# Altium footprint library ThanhNT.PcbLib: 579 footprints (part 23 of 37)
Each footprint in its own frame and in the unit in brackets; x right, y up, seen from the top. Pads: shape width x height; smd on the part's side, far side on the other; paste and mask are expansions set on the pad; w line width, h text height; cw(c..) or ccw(c..) is an arc to the next point about the centre after c.
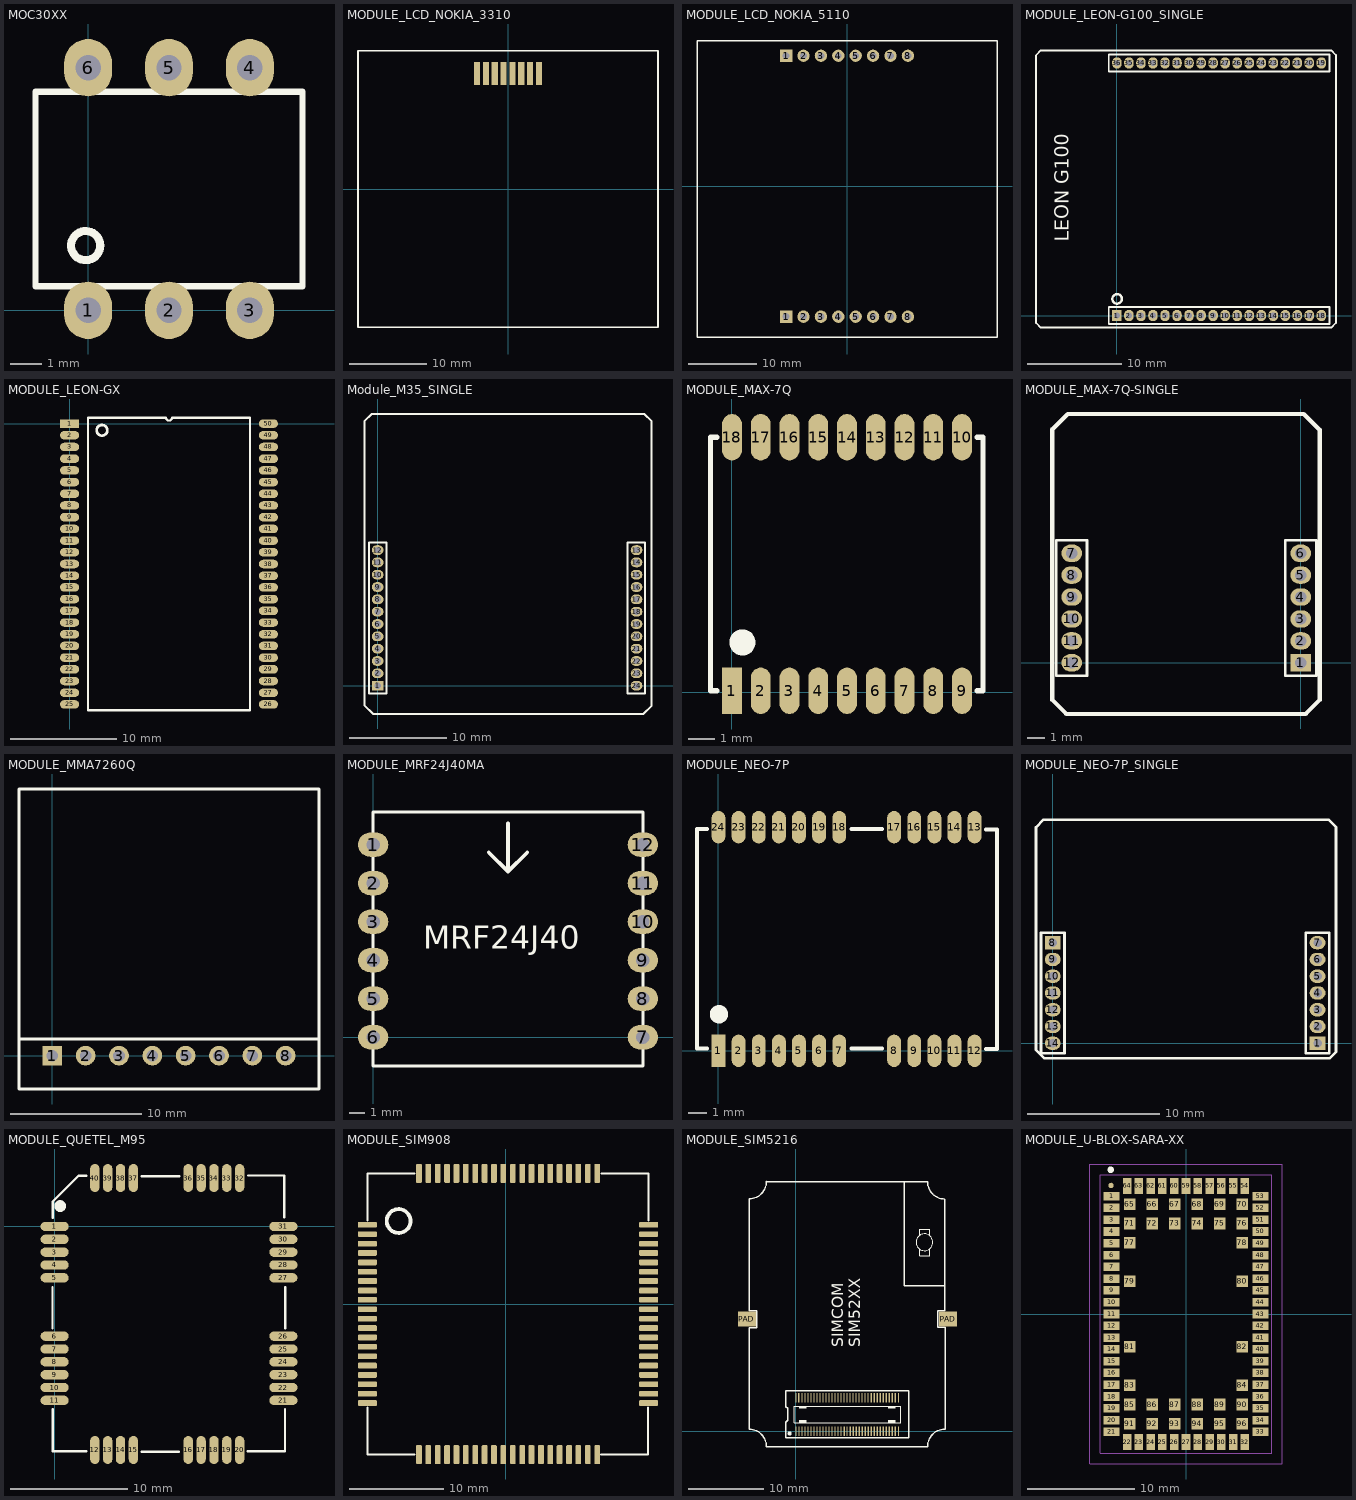
[diagram p22: the footprints below, top view; thin cyan lines are the x and y axes]

## MOC30XX [mm]
pads (6):
  oval 1.5x1.8 hole 0.8: 1(0,0) 2(2.54,0) 3(5.08,0) 4(5.08,7.62) 5(2.54,7.62) 6(0,7.62)
Top Overlay:
  circle w0.254: c-0.077,2.032 r0.458
  lines w0.2: -1.651,0.762 6.731,0.762 6.731,6.858 -1.651,6.858 -1.651,0.762
3D body "SW3DPS-DIP6-DEFAULT.step": height 4.41, standoff -3.18, extent -1.5,-0.19 6.58,7.81

## MODULE_LCD_NOKIA_3310 [mm] "NOKIA 3310 LCD"
height 3
pads (8):
  rect 0.8x3 smd: 1(4.025,15) 2(2.875,15) 3(1.725,15) 4(0.575,15) 5(-0.575,15) 6(-1.725,15) 7(-2.875,15) 8(-4.025,15)
Top Overlay:
  lines w0.2: -19.5,-18 -19.5,18 19.5,18 19.5,-18 -19.5,-18
3D body "NOKIA 3310.STEP": height 2.06, standoff 0.04, extent -19.25,-17.75 19.25,17.75

## MODULE_LCD_NOKIA_5110 [mm] "NOKIA 5110 LCD"
height 10.254
pads (16):
  rect 1.8x1.8 hole 1: 1(-8.89,-19.05) 1(-8.89,19.05)
  round 1.8 hole 1: 2(-6.35,-19.05) 2(-6.35,19.05) 3(-3.81,-19.05) 3(-3.81,19.05) 4(-1.27,-19.05) 4(-1.27,19.05) 5(1.27,-19.05) 5(1.27,19.05) 6(3.81,-19.05) 6(3.81,19.05) 7(6.35,-19.05) 7(6.35,19.05) 8(8.89,-19.05) 8(8.89,19.05)
Top Overlay:
  lines w0.2: -21.9,-22.029 -21.9,21.209 21.9,21.209 21.9,-22.029 -21.9,-22.029
3D body "NOKIA 5110 BreakOut Board.STEP": height 11.5, standoff 6.5, extent -21.876,-22.031 21.724,21.269
3D body "User Library-Header_Male_8Pin.STEP": height 8.54, standoff -3, extent -10.185,-20.269 10.135,-17.779
3D body "User Library-Header_Male_8Pin.STEP": height 8.54, standoff -3, extent -10.16,17.855 10.16,20.345

## MODULE_LEON-G100_SINGLE [mm]
pads (36):
  rect 1x1.2 hole 0.65: 1(0,0)
  oval 1x1.2 hole 0.65: 2(1.27,0) 3(2.54,0) 4(3.81,0) 5(5.08,0) 6(6.35,0) 7(7.62,0) 8(8.89,0) 9(10.16,0) 10(11.43,0) 11(12.7,0) 12(13.97,0) 13(15.24,0) 14(16.51,0) 15(17.78,0) 16(19.05,0) 17(20.32,0) 18(21.59,0) 19(21.59,26.67) 20(20.32,26.67) 21(19.05,26.67) 22(17.78,26.67) 23(16.51,26.67) 24(15.24,26.67) 25(13.97,26.67) 26(12.7,26.67) 27(11.43,26.67) 28(10.16,26.67) 29(8.89,26.67) 30(7.62,26.67) 31(6.35,26.67) 32(5.08,26.67) 33(3.81,26.67) 34(2.54,26.67) 35(1.27,26.67) 36(0,26.67)
Top Overlay:
  circle w0.25: c0.025,1.753 r0.5
  lines w0.2: -8.544,-0.778 -8.544,27.473 -8.026,27.991 22.657,27.991 23.139,27.508 23.139,-0.787 22.657,-1.27 -8.052,-1.27 -8.544,-0.778 ; -0.864,-0.914 22.454,-0.914 22.454,0.914 -0.864,0.914 -0.864,-0.914 ; -0.864,25.756 -0.864,27.584 22.454,27.584 22.454,25.756 -0.864,25.756
  text "LEON G100" at -4.547,7.798 h2.54

## MODULE_LEON-GX [mm]
pads (50):
  rect 1.8x0.8 smd: 1(0,0)
  oval 1.8x0.8 smd: 2(0,-1.1) 3(0,-2.2) 4(0,-3.3) 5(0,-4.4) 6(0,-5.5) 7(0,-6.6) 8(0,-7.7) 9(0,-8.8) 10(0,-9.9) 11(0,-11) 12(0,-12.1) 13(0,-13.2) 14(0,-14.3) 15(0,-15.4) 16(0,-16.5) 17(0,-17.6) 18(0,-18.7) 19(0,-19.8) 20(0,-20.9) 21(0,-22) 22(0,-23.1) 23(0,-24.2) 24(0,-25.3) 25(0,-26.4) 26(18.7,-26.4) 27(18.7,-25.3) 28(18.7,-24.2) 29(18.7,-23.1) 30(18.7,-22) 31(18.7,-20.9) 32(18.7,-19.8) 33(18.7,-18.7) 34(18.7,-17.6) 35(18.7,-16.5) 36(18.7,-15.4) 37(18.7,-14.3) 38(18.7,-13.2) 39(18.7,-12.1) 40(18.7,-11) 41(18.7,-9.9) 42(18.7,-8.8) 43(18.7,-7.7) 44(18.7,-6.6) 45(18.7,-5.5) 46(18.7,-4.4) 47(18.7,-3.3) 48(18.7,-2.2) 49(18.7,-1.1) 50(18.7,0)
Top Overlay:
  circle w0.25: c3.048,-0.635 r0.5
  lines w0.2: 1.735,-26.95 16.965,-26.95 16.965,0.55 9.625,0.55 cw(c9.35,0.55) 9.075,0.55 1.735,0.55 1.735,-26.95
3D body "User Library-LEON-G200.STEP": height 3.3, standoff -0.02, extent 0,-27.95 18.92,1.55

## Module_M35_SINGLE [mm]
pads (24):
  rect 1.2x1 hole 0.65: 1(0,0)
  oval 1.2x1 hole 0.65: 2(0,1.27) 3(0,2.54) 4(0,3.81) 5(0,5.08) 6(0,6.35) 7(0,7.62) 8(0,8.89) 9(0,10.16) 10(0,11.43) 11(0,12.7) 12(0,13.97) 13(26.67,13.97) 14(26.67,12.7) 15(26.67,11.43) 16(26.67,10.16) 17(26.67,8.89) 18(26.67,7.62) 19(26.67,6.35) 20(26.67,5.08) 21(26.67,3.81) 22(26.67,2.54) 23(26.67,1.27) 24(26.67,0)
Top Overlay:
  lines w0.2: -1.372,-2.032 -0.483,-2.921 27.356,-2.921 28.219,-2.057 28.219,27.254 27.483,27.991 -0.635,27.991 -1.372,27.254 -1.372,-2.032 ; -0.914,-0.813 0.889,-0.813 0.889,14.732 -0.914,14.732 -0.914,-0.813 ; 25.756,-0.813 25.756,14.732 27.559,14.732 27.559,-0.813 25.756,-0.813

## MODULE_MAX-7Q [mil]
pads (18):
  rect 30x70 smd: 1(0,1.97)
  oval 30x70 smd: 2(43.31,1.97) 3(86.61,1.97) 4(129.92,1.97) 5(173.23,1.97) 6(216.54,1.97) 7(259.84,1.97) 8(303.15,1.97) 9(346.46,1.97) 10(346.46,383.86) 11(303.15,383.86) 12(259.84,383.86) 13(216.54,383.86) 14(173.23,383.86) 15(129.92,383.86) 16(86.61,383.86) 17(43.31,383.86) 18(0,383.86)
Top Overlay:
  circle w19.68: c15.75,74.8 r9.84
  lines w7.87: -22.64,1.97 -32.48,1.97 -32.48,383.86 -22.64,383.86 ; 369.09,1.97 377.95,1.97 377.95,383.86 369.09,383.86
3D body "User Library-L70.STEP": height 98.93, standoff 0.11, extent -25.59,1.18 372.05,383.86

## MODULE_MAX-7Q-SINGLE [mm]
pads (12):
  rect 1.2x1 hole 0.65: 1(0,0)
  oval 1.2x1 hole 0.65: 2(0,1.27) 3(0,2.54) 5(0,5.08) 7(-13.284,6.35) 8(-13.284,5.08) 9(-13.284,3.81) 10(-13.284,2.54) 11(-13.284,1.27) 12(-13.284,0)
  oval 1.2x1 hole 0.65 paste+0: 4(0,3.81) 6(0,6.35)
Top Overlay:
  lines w0.15: -14.173,-0.762 -12.395,-0.762 -12.395,7.112 -14.173,7.112 -14.173,-0.762 ; -0.889,-0.762 -0.889,7.112 0.889,7.112 0.889,-0.762 -0.889,-0.762
  lines w0.254: -14.402,-2.159 -13.589,-2.972 0.279,-2.972 1.092,-2.159 1.092,13.513 0.178,14.427 -13.513,14.427 -14.402,13.538 -14.402,-2.159

## MODULE_MMA7260Q [mm] "Connector; Header; 8 Position"
pads (8):
  rect 1.5x1.5 hole 0.9: 1(0,0)
  round 1.5 hole 0.9: 2(2.54,0) 3(5.08,0) 4(7.62,0) 5(10.16,0) 6(12.7,0) 7(15.24,0) 8(17.78,0)
Top Overlay:
  lines w0.2: -2.54,1.27 20.32,1.27 ; -2.54,-2.54 -2.54,20.32 20.32,20.32 20.32,-2.54 -2.54,-2.54
3D body: height 2, standoff 1, extent 7.62,7.62 13.97,13.97
3D body: height 1, standoff 0, extent -2.54,-2.54 20.32,20.32

## MODULE_MRF24J40MA [mm] "Microchip Zigbee Module"
pads (12):
  oval 2x1.6 hole 0.9: 1(0,12.7) 2(0,10.16) 3(0,7.62) 4(0,5.08) 5(0,2.54) 6(0,0) 7(17.78,0) 8(17.78,2.54) 9(17.78,5.08) 10(17.78,7.62) 11(17.78,10.16) 12(17.78,12.7)
Top Overlay:
  lines w0.2: 0,8.255 0,-1.905 ; 0,-1.905 17.78,-1.905 17.78,14.859 0,14.859 0,-1.905
  lines w0.254: 7.62,12.192 8.89,10.922 ; 8.89,14.097 8.89,10.922 ; 10.16,12.192 8.89,10.922
  text "MRF24J40" at 3.302,5.842 h1.52
3D body "User Library-MRF24J40MA2.STEP": height 3.11, standoff 0.01, extent 0,-13.691 17.78,14.249

## MODULE_NEO-7P [mil]
pads (24):
  rect 30x70 smd: 1(0,0)
  oval 30x70 smd: 2(43.31,0) 3(86.61,0) 4(129.92,0) 5(173.23,0) 6(216.54,0) 7(259.84,0) 8(377.95,0) 9(421.26,0) 10(464.57,0) 11(507.87,0) 12(551.18,0) 13(551.18,481.3) 14(507.87,481.3) 15(464.57,481.3) 16(421.26,481.3) 17(377.95,481.3) 18(259.84,481.3) 19(216.54,481.3) 20(173.23,481.3) 21(129.92,481.3) 22(86.61,481.3) 23(43.31,481.3) 24(0,481.3)
Top Overlay:
  circle w19.68: c0.98,78.74 r9.84
  lines w7.87: -24.61,4.92 -46.26,4.92 -46.26,477.36 -24.61,477.36 ; 285.43,4.92 352.36,4.92 ; 285.43,477.36 352.36,477.36 ; 575.79,3.94 599.41,3.94 599.41,476.38 575.79,476.38
3D body "User Library-UBLOX_GPS_NEO-6M.STEP": height 103.94, standoff 0, extent -51.18,-2.95 602.36,483.66

## MODULE_NEO-7P_SINGLE [mm]
pads (14):
  rect 1.2x1 hole 0.65: 1(20.066,0) 8(0,7.62)
  oval 1.2x1 hole 0.65: 2(20.066,1.27) 3(20.066,2.54) 4(20.066,3.81) 5(20.066,5.08) 6(20.066,6.35) 7(20.066,7.62) 9(0,6.35) 10(0,5.08) 11(0,3.81) 12(0,2.54) 13(0,1.27) 14(0,0)
Top Overlay:
  lines w0.2: -1.27,-0.508 -1.27,16.358 -0.686,16.942 20.904,16.942 21.463,16.383 21.463,-0.66 20.98,-1.143 -0.635,-1.143 -1.27,-0.508 ; -0.889,-0.762 0.889,-0.762 0.889,8.382 -0.889,8.382 -0.889,-0.762 ; 19.177,-0.762 19.177,8.382 20.955,8.382 20.955,-0.762 19.177,-0.762

## MODULE_QUETEL_M95 [mm]
pads (40):
  oval 2.4x0.8 smd: 1(0,0) 2(0,-1.1) 3(0,-2.2) 4(0,-3.3) 5(0,-4.4) 6(0,-9.4) 7(0,-10.5) 8(0,-11.6) 9(0,-12.7) 10(0,-13.8) 11(0,-14.9) 21(19.6,-14.9) 22(19.6,-13.8) 23(19.6,-12.7) 24(19.6,-11.6) 25(19.6,-10.5) 26(19.6,-9.4) 27(19.6,-4.4) 28(19.6,-3.3) 29(19.6,-2.2) 30(19.6,-1.1) 31(19.6,0)
  oval 0.8x2.4 smd: 12(3.45,-19.15) 13(4.55,-19.15) 14(5.65,-19.15) 15(6.75,-19.15) 16(11.45,-19.15) 17(12.55,-19.15) 18(13.65,-19.15) 19(14.75,-19.15) 20(15.85,-19.15) 32(15.85,4.15) 33(14.75,4.15) 34(13.65,4.15) 35(12.55,4.15) 36(11.45,4.15) 37(6.75,4.15) 38(5.65,4.15) 39(4.55,4.15) 40(3.45,4.15)
Top Overlay:
  circle w0.5: c0.476,1.748 r0.25
  lines w0.2: -0.178,-8.712 -0.178,-5.182 ; -0.152,-15.646 -0.152,-19.253 2.718,-19.253 ; -0.152,0.737 -0.152,2.134 2.057,4.343 2.718,4.343 ; 7.442,-19.304 10.643,-19.304 ; 7.468,4.293 10.668,4.293 ; 16.535,-19.253 19.736,-19.253 19.736,-15.646 ; 16.561,4.369 19.685,4.369 19.685,0.762 ; 19.761,-8.712 19.761,-5.182
3D body "User Library-Quectel M95.STEP": height 2.66, standoff 0, extent -0.146,-19.282 19.754,4.318

## MODULE_SIM908 [mil]
pads (80):
  rrect30% 79x24 smd: ADC(600,-178.35) DISP-CLK(-581.1,137) DISP-CS(-581.1,19) DISP-DATA(-581.1,98) DISP-DC(-581.1,58) GND(-581.1,334) GND2(-581.1,295) GND3(-581.1,176) GND4(-581.1,-20.87) GND5(-581.1,-178.35) GND8(600,-414.57) GND9(600,-335.83) GND10(600,216) GND11(600,255) GND12(600,334) GPS-DBG-RXD(-581.1,-257.09) GPS-DBG-TXD(-581.1,-217.72) GSM-ANTINA(600,295) NC(-581.1,216) NC2(-581.1,-60.24) NC3(-581.1,-99.61) NC4(-581.1,-138.98) NC9(600,-257.09) NC10(600,-217.72) NC11(600,58) NC12(600,98) NETLIGHT(600,-20.87) PWM1(600,-138.98) PWM2(600,-99.61) PWM3(600,-60.24) PWRKEY(-581.1,255) SCL(600,137) SDA(600,176) SIM-CLK(-581.1,-375.2) SIM-DATA(-581.1,-296.46) SIM-RST(-581.1,-335.83) SIM-VDD(-581.1,-414.57) STATUS(600,19) VDD-EXT(600,-296.46) VRTC(600,-375.2)
  rrect30% 24x79 smd: CTS(148,550) DCD(30,550) DTR(-49.61,550) GND6(266,-631.1) GND7(384,-631.1) GND13(-364.57,550) GND14(-285.83,550) GND15(-246.46,550) GND16(226,550) GND17(266,550) GND18(384,550) GPIO1(30,-631.1) GPIO2(69,-631.1) GPIO3(108,-631.1) GPIO4(148,-631.1) GPIO5(187,-631.1) GPIO6(226,-631.1) GPS-ANTINA(-325.2,550) GPS-VANT-IN(-207.09,550) GPS-VANT-OUT(-167.72,550) MIC1N(-246.46,-631.1) MIC1P(-285.83,-631.1) MIC2N(-88.98,-631.1) MIC2P(-128.35,-631.1) NC5(-49.61,-631.1) NC6(-10.24,-631.1) NC7(305,-631.1) NC8(345,-631.1) RI(69,550) RTS(187,550) RXD(108,550) SPK1N(-364.57,-631.1) SPK1P(-325.2,-631.1) SPK2N(-207.09,-631.1) SPK2P(-167.72,-631.1) TEMP-BAT(-88.98,550) TXD(-10.24,550) VBAT(345,550) VBAT2(305,550) VCHG(-128.35,550)
Top Overlay:
  circle w16: c-450,350 r50
  lines w7.87: -581.1,-433.1 -581.1,-631.1 -383.1,-631.1 ; -581.1,352 -581.1,550 -383.1,550 ; 400,-631 598,-631 598,-433 ; 402,550 600,550 600,352
Mechanical 2:
Mechanical 4:
3D body "User Library-SIM908.STEP": height 126.47, standoff 0.48, extent -582.3,-631.22 598.81,549.88

## MODULE_SIM5216 [mm] "Board to Board Connector (SIM5215, 5216, 5218)"
pads (72):
  rect 0.16x1.3 smd: 1(0,0) 2(0.4,0) 3(0.8,0) 4(1.2,0) 5(1.6,0) 6(2,0) 7(2.4,0) 8(2.8,0) 9(3.2,0) 10(3.6,0) 11(4,0) 12(4.4,0) 13(4.8,0) 14(5.2,0) 15(5.6,0) 16(6,0) 17(6.42,0.01) 18(6.8,0) 19(7.2,0) 20(7.6,0) 21(8,0) 22(8.4,0) 23(8.8,0) 24(9.2,0) 25(9.6,0) 26(10,0) 27(10.4,0) 28(10.8,0) 29(11.2,0) 30(11.6,0) 31(12,0) 32(12.4,0) 33(12.8,0) 34(13.2,0) 35(13.6,0) 36(13.6,4.44) 37(13.189,4.44) 38(12.789,4.44) 39(12.389,4.44) 40(11.989,4.44) 41(11.589,4.44) 42(11.189,4.44) 43(10.789,4.44) 44(10.389,4.44) 45(9.989,4.44) 46(9.589,4.44) 47(9.189,4.44) 48(8.789,4.44) 49(8.389,4.44) 50(7.989,4.44) 51(7.589,4.44) 52(7.189,4.44) 53(6.789,4.44) 54(6.389,4.44) 55(5.989,4.44) 56(5.589,4.44) 57(5.189,4.44) 58(4.789,4.44) 59(4.389,4.44) 60(3.989,4.44) 61(3.589,4.44) 62(3.189,4.44) 63(2.789,4.44) 64(2.389,4.44) 65(1.989,4.44) 66(1.589,4.44) 67(1.189,4.44) 68(0.789,4.44) 69(0.389,4.44) 70(0,4.44)
  rect 2.4x2 smd: PAD(-6.502,14.884) PAD(20.193,14.884)
Top Overlay:
  circle w0.127: c17.069,25.095 r1.116
  circle w0.254: c-0.838,-0.279 r0.156
  rectangle: 12.22,1.17 13.19,1.48
  rectangle: 12.22,3.02 13.19,3.33
  rectangle: 0.42,1.17 1.39,1.48
  rectangle: 0.42,3.02 1.39,3.33
  lines w0.127: 16.459,24.181 16.459,23.317 17.755,23.317 17.755,24.13 ; 16.51,26.035 16.459,26.035 16.459,26.848 17.755,26.848 17.755,25.984 ; -0.2,1.13 -0.2,3.34 13.9,3.34 13.9,1.13 -0.2,1.13
  lines w0.178: -1.321,-0.889 -1.321,1.225 -1.091,1.455 -1.091,3.045 -1.321,3.275 -1.321,5.359 14.979,5.359 14.979,-0.889 -1.321,-0.889
  lines w0.2: -3.912,33.172 cw(c-6.223,33.172) -6.223,30.861 -6.223,16.002 -5.207,16.002 -5.207,13.767 -6.223,13.767 -6.223,0.279 cw(c-6.223,-2.032) -3.912,-2.032 17.475,-2.032 cw(c19.787,-2.032) 19.787,0.279 ; -3.886,33.147 17.475,33.147 ccw(c19.787,33.147) 19.787,30.836 19.787,15.977 18.847,15.977 18.847,13.792 19.812,13.792 19.812,0.279 ; 14.402,33.147 14.402,19.329 19.787,19.329
  text "SIMCOM / SIM52XX" at 8.56,11.125 h1.52
3D body "User Library-SIM5215_SIM5216.STEP": height -0.5, standoff -5.4, extent -7.518,-2.686 21.082,33.064
3D body "axk770247.stp": height 1.92, standoff 0, extent -1.343,-0.315 14.957,4.785

## MODULE_U-BLOX-SARA-XX [mil]
pads (97):
  rect 59.06x31.5 smd: 1(-273.62,433.07) 2(-273.62,389.76) 3(-273.62,346.46) 4(-273.62,303.15) 5(-273.62,259.84) 6(-273.62,216.54) 7(-273.62,173.23) 8(-273.62,129.92) 9(-273.62,86.61) 10(-273.62,43.31) 11(-273.62,0) 12(-273.62,-43.31) 13(-273.62,-86.61) 14(-273.62,-129.92) 15(-273.62,-173.23) 16(-273.62,-216.54) 17(-273.62,-259.84) 18(-273.62,-303.15) 19(-273.62,-346.46) 20(-273.62,-389.76) 21(-273.62,-433.07) 33(273.62,-433.07) 34(273.62,-389.76) 35(273.62,-346.46) 36(273.62,-303.15) 37(273.62,-259.84) 38(273.62,-216.54) 39(273.62,-173.23) 40(273.62,-129.92) 41(273.62,-86.61) 42(273.62,-43.31) 43(273.62,0) 44(273.62,43.31) 45(273.62,86.61) 46(273.62,129.92) 47(273.62,173.23) 48(273.62,216.54) 49(273.62,259.84) 50(273.62,303.15) 51(273.62,346.46) 52(273.62,389.76) 53(273.62,433.07)
  rect 31.5x59.06 smd: 22(-216.54,-470.47) 23(-173.23,-470.47) 24(-129.92,-470.47) 25(-86.61,-470.47) 26(-43.31,-470.47) 27(0,-470.47) 28(43.31,-470.47) 29(86.61,-470.47) 30(129.92,-470.47) 31(173.23,-470.47) 32(216.54,-470.47) 54(216.54,470.47) 55(173.23,470.47) 56(129.92,470.47) 57(86.61,470.47) 58(43.31,470.47) 59(0,470.47) 60(-43.31,470.47) 61(-86.61,470.47) 62(-129.92,470.47) 63(-173.23,470.47) 64(-216.54,470.47)
  rect 43.31x43.31 smd: 65(-206.69,403.54) 66(-124.02,403.54) 67(-41.34,403.54) 68(41.34,403.54) 69(124.02,403.54) 70(206.69,403.54) 71(-206.69,332.68) 72(-124.02,332.68) 73(-41.34,332.68) 74(41.34,332.68) 75(124.02,332.68) 76(206.69,332.68) 77(-206.69,261.81) 78(206.69,261.81) 79(-206.69,120.08) 80(206.69,120.08) 81(-206.69,-120.08) 82(206.69,-120.08) 83(-206.69,-261.81) 84(206.69,-261.81) 85(-206.69,-332.68) 86(-124.02,-332.68) 87(-41.34,-332.68) 88(41.34,-332.68) 89(124.02,-332.68) 90(206.69,-332.68) 91(-206.69,-403.54) 92(-124.02,-403.54) 93(-41.34,-403.54) 94(41.34,-403.54) 95(124.02,-403.54) 96(206.69,-403.54)
  rrect100% 19.69x19.69 smd: FID_PIN1(-275.59,472.44)
Top Overlay:
  circle w15.75: c-276.65,530.07 r3.94
Top Paste:
  rectangle: 187.01,-281.5 226.38,-242.13
  rectangle: 104.33,-423.23 143.7,-383.86
  rectangle: 187.01,-423.23 226.38,-383.86
  rectangle: 187.01,-352.36 226.38,-312.99
  rectangle: 104.33,-352.36 143.7,-312.99
  rectangle: 21.65,-352.36 61.02,-312.99
  rectangle: 21.65,-423.23 61.02,-383.86
  rectangle: -61.02,-423.23 -21.65,-383.86
  rectangle: -61.02,-352.36 -21.65,-312.99
  rectangle: -143.7,-352.36 -104.33,-312.99
  rectangle: -143.7,-423.23 -104.33,-383.86
  rectangle: -226.38,-423.23 -187.01,-383.86
  rectangle: -226.38,-352.36 -187.01,-312.99
  rectangle: -226.38,-281.5 -187.01,-242.13
  rectangle: 187.01,-139.76 226.38,-100.39
  rectangle: -226.38,-139.76 -187.01,-100.39
  rectangle: -226.38,100.39 -187.01,139.76
  rectangle: 187.01,100.39 226.38,139.76
  rectangle: 187.01,242.13 226.38,281.5
  rectangle: 187.01,312.99 226.38,352.36
  rectangle: 104.33,312.99 143.7,352.36
  rectangle: 21.65,312.99 61.02,352.36
  rectangle: -61.02,312.99 -21.65,352.36
  rectangle: -143.7,312.99 -104.33,352.36
  rectangle: -226.38,242.13 -187.01,281.5
  rectangle: -226.38,312.99 -187.01,352.36
  rectangle: -226.38,383.86 -187.01,423.23
  rectangle: -143.7,383.86 -104.33,423.23
  rectangle: -61.02,383.86 -21.65,423.23
  rectangle: 21.65,383.86 61.02,423.23
  rectangle: 104.33,383.86 143.7,423.23
  rectangle: 187.01,383.86 226.38,423.23
  rectangle: 246.06,-446.85 301.18,-419.29
  rectangle: 246.06,-403.54 301.18,-375.98
  rectangle: 246.06,-360.24 301.18,-332.68
  rectangle: 246.06,-316.93 301.18,-289.37
  rectangle: 246.06,-273.62 301.18,-246.06
  rectangle: 246.06,-230.32 301.18,-202.76
  rectangle: 246.06,-187.01 301.18,-159.45
  rectangle: 246.06,-143.7 301.18,-116.14
  rectangle: 246.06,-100.39 301.18,-72.83
  rectangle: 246.06,-57.09 301.18,-29.53
  rectangle: 246.06,-13.78 301.18,13.78
  rectangle: 246.06,29.53 301.18,57.09
  rectangle: 246.06,72.83 301.18,100.39
  rectangle: 246.06,116.14 301.18,143.7
  rectangle: 246.06,159.45 301.18,187.01
  rectangle: 246.06,202.76 301.18,230.32
  rectangle: 246.06,246.06 301.18,273.62
  rectangle: 246.06,289.37 301.18,316.93
  rectangle: 246.06,332.68 301.18,360.24
  rectangle: 246.06,375.98 301.18,403.54
  rectangle: -301.18,-446.85 -246.06,-419.29
  rectangle: -301.18,-403.54 -246.06,-375.98
  rectangle: -301.18,-360.24 -246.06,-332.68
  rectangle: -301.18,-316.93 -246.06,-289.37
  rectangle: -301.18,-273.62 -246.06,-246.06
  rectangle: -301.18,-230.32 -246.06,-202.76
  rectangle: -301.18,-187.01 -246.06,-159.45
  rectangle: -301.18,-143.7 -246.06,-116.14
  rectangle: -301.18,-100.39 -246.06,-72.83
  rectangle: -301.18,-57.09 -246.06,-29.53
  rectangle: -301.18,-13.78 -246.06,13.78
  rectangle: -301.18,29.53 -246.06,57.09
  rectangle: -301.18,72.83 -246.06,100.39
  rectangle: -301.18,116.14 -246.06,143.7
  rectangle: -301.18,159.45 -246.06,187.01
  rectangle: -301.18,202.76 -246.06,230.32
  rectangle: -301.18,246.06 -246.06,273.62
  rectangle: -301.18,289.37 -246.06,316.93
  rectangle: -301.18,332.68 -246.06,360.24
  rectangle: -301.18,375.98 -246.06,403.54
  rectangle: -301.18,419.29 -246.06,446.85
  rectangle: -230.32,-498.03 -202.76,-442.91
  rectangle: -187.01,-498.03 -159.45,-442.91
  rectangle: -143.7,-498.03 -116.14,-442.91
  rectangle: -100.39,-498.03 -72.83,-442.91
  rectangle: -57.09,-498.03 -29.53,-442.91
  rectangle: -13.78,-498.03 13.78,-442.91
  rectangle: 29.53,-498.03 57.09,-442.91
  rectangle: 72.83,-498.03 100.39,-442.91
  rectangle: 116.14,-498.03 143.7,-442.91
  rectangle: 159.45,-498.03 187.01,-442.91
  rectangle: 202.76,-498.03 230.32,-442.91
  rectangle: -230.32,442.91 -202.76,498.03
  rectangle: -187.01,442.91 -159.45,498.03
  rectangle: -143.7,442.91 -116.14,498.03
  rectangle: -100.39,442.91 -72.83,498.03
  rectangle: -57.09,442.91 -29.53,498.03
  rectangle: -13.78,442.91 13.78,498.03
  rectangle: 29.53,442.91 57.09,498.03
  rectangle: 72.83,442.91 100.39,498.03
  rectangle: 116.14,442.91 143.7,498.03
  rectangle: 159.45,442.91 187.01,498.03
  rectangle: 246.06,419.29 301.18,446.85
  rectangle: 202.76,442.91 230.32,498.03
Top Solder:
  rectangle: -230.32,-427.17 -183.07,-379.92
  rectangle: -147.64,-427.17 -100.39,-379.92
  rectangle: -64.96,-427.17 -17.72,-379.92
  rectangle: 183.07,-427.17 230.32,-379.92
  rectangle: 100.39,-427.17 147.64,-379.92
  rectangle: 17.72,-427.17 64.96,-379.92
  rectangle: 17.72,-356.3 64.96,-309.06
  rectangle: 100.39,-356.3 147.64,-309.06
  rectangle: 183.07,-356.3 230.32,-309.06
  rectangle: 183.07,-285.43 230.32,-238.19
  rectangle: -64.96,-356.3 -17.72,-309.06
  rectangle: -147.64,-356.3 -100.39,-309.06
  rectangle: -230.32,-356.3 -183.07,-309.06
  rectangle: -230.32,-285.43 -183.07,-238.19
  rectangle: -230.32,-143.7 -183.07,-96.46
  rectangle: 183.07,-143.7 230.32,-96.46
  rectangle: 183.07,96.46 230.32,143.7
  rectangle: -230.32,96.46 -183.07,143.7
  rectangle: 183.07,238.19 230.32,285.43
  rectangle: -230.32,238.19 -183.07,285.43
  rectangle: -230.32,309.06 -183.07,356.3
  rectangle: -147.64,309.06 -100.39,356.3
  rectangle: -64.96,309.06 -17.72,356.3
  rectangle: -64.96,379.92 -17.72,427.17
  rectangle: -147.64,379.92 -100.39,427.17
  rectangle: -230.32,379.92 -183.07,427.17
  rectangle: 183.07,309.06 230.32,356.3
  rectangle: 100.39,309.06 147.64,356.3
  rectangle: 17.72,309.06 64.96,356.3
  rectangle: 17.72,379.92 64.96,427.17
  rectangle: 100.39,379.92 147.64,427.17
  rectangle: 183.07,379.92 230.32,427.17
  rectangle: 242.13,-450.79 305.12,-415.35
  rectangle: 242.13,-407.48 305.12,-372.05
  rectangle: 242.13,-364.17 305.12,-328.74
  rectangle: 242.13,-320.87 305.12,-285.43
  rectangle: 242.13,-277.56 305.12,-242.13
  rectangle: 242.13,-234.25 305.12,-198.82
  rectangle: 242.13,-190.94 305.12,-155.51
  rectangle: 242.13,-147.64 305.12,-112.2
  rectangle: 242.13,-104.33 305.12,-68.9
  rectangle: 242.13,-61.02 305.12,-25.59
  rectangle: 242.13,-17.72 305.12,17.72
  rectangle: 242.13,25.59 305.12,61.02
  rectangle: 242.13,68.9 305.12,104.33
  rectangle: 242.13,112.2 305.12,147.64
  rectangle: 242.13,328.74 305.12,364.17
  rectangle: 242.13,155.51 305.12,190.94
  rectangle: 242.13,198.82 305.12,234.25
  rectangle: 242.13,242.13 305.12,277.56
  rectangle: 242.13,285.43 305.12,320.87
  rectangle: 242.13,372.05 305.12,407.48
  rectangle: -305.12,-450.79 -242.13,-415.35
  rectangle: -305.12,-407.48 -242.13,-372.05
  rectangle: -305.12,-364.17 -242.13,-328.74
  rectangle: -305.12,-320.87 -242.13,-285.43
  rectangle: -305.12,-277.56 -242.13,-242.13
  rectangle: -305.12,-234.25 -242.13,-198.82
  rectangle: -305.12,-190.94 -242.13,-155.51
  rectangle: -305.12,-147.64 -242.13,-112.2
  rectangle: -305.12,-104.33 -242.13,-68.9
  rectangle: -305.12,-61.02 -242.13,-25.59
  rectangle: -305.12,-17.72 -242.13,17.72
  rectangle: -305.12,25.59 -242.13,61.02
  rectangle: -305.12,68.9 -242.13,104.33
  rectangle: -305.12,112.2 -242.13,147.64
  rectangle: -305.12,328.74 -242.13,364.17
  rectangle: -305.12,155.51 -242.13,190.94
  rectangle: -305.12,198.82 -242.13,234.25
  rectangle: -305.12,242.13 -242.13,277.56
  rectangle: -305.12,285.43 -242.13,320.87
  rectangle: -305.12,372.05 -242.13,407.48
  rectangle: -305.12,415.35 -242.13,450.79
  rectangle: -234.25,-501.97 -198.82,-438.98
  rectangle: -190.94,-501.97 -155.51,-438.98
  rectangle: -147.64,-501.97 -112.2,-438.98
  rectangle: -104.33,-501.97 -68.9,-438.98
  rectangle: -61.02,-501.97 -25.59,-438.98
  rectangle: -17.72,-501.97 17.72,-438.98
  rectangle: 25.59,-501.97 61.02,-438.98
  rectangle: 68.9,-501.97 104.33,-438.98
  rectangle: 112.2,-501.97 147.64,-438.98
  rectangle: 155.51,-501.97 190.94,-438.98
  rectangle: 198.82,-501.97 234.25,-438.98
  rectangle: -234.25,438.98 -198.82,501.97
  rectangle: -190.94,438.98 -155.51,501.97
  rectangle: -147.64,438.98 -112.2,501.97
  rectangle: -104.33,438.98 -68.9,501.97
  rectangle: -61.02,438.98 -25.59,501.97
  rectangle: -17.72,438.98 17.72,501.97
  rectangle: 25.59,438.98 61.02,501.97
  rectangle: 68.9,438.98 104.33,501.97
  rectangle: 112.2,438.98 147.64,501.97
  rectangle: 155.51,438.98 190.94,501.97
  rectangle: 242.13,415.35 305.12,450.79
  rectangle: 198.82,438.98 234.25,501.97
Mechanical 15:
  lines w1.97: -354.33,-551.18 354.33,-551.18 354.33,551.18 -354.33,551.18 -354.33,-551.18
Mechanical 16:
  lines w3.94: -314.96,-511.81 314.96,-511.81 314.96,511.81 -314.96,511.81 -314.96,-511.81
  text "96" at 192.91,-413.39 h17
  text "91" at -220.47,-413.39 h17
  text "90" at 192.91,-342.52 h17
  text "85" at -220.47,-342.52 h17
  text "84" at 192.91,-271.65 h17
  text "83" at -220.47,-271.65 h17
  text "81" at -220.47,-129.92 h17
  text "82" at 192.91,-129.92 h17
  text "80" at 192.91,110.24 h17
  text "79" at -220.47,110.24 h17
  text "78" at 192.91,251.97 h17
  text "77" at -220.47,251.97 h17
  text "76" at 192.91,322.83 h17
  text "71" at -220.47,322.83 h17
  text "70" at 192.91,393.7 h17
  text "65" at -224.41,393.7 h17
  text "64" at -204.72,456.69 h17
  text "54" at 228.35,456.69 h17
  text "53" at 259.84,421.26 h17
  text "33" at 259.84,-444.88 h17
  text "32" at 228.35,-484.25 h17
  text "23" at -204.72,-484.25 h17
  text "22" at -287.4,-444.88 h17
  text "1" at -279.53,421.26 h17